# Altium footprint library Connectors_THT.PcbLib: 111 footprints (part 11 of 11)
Each footprint in its own frame and in the unit in brackets; x right, y up, seen from the top. Pads: shape width x height; smd on the part's side, far side on the other; paste and mask are expansions set on the pad; w line width, h text height; cw(c..) or ccw(c..) is an arc to the next point about the centre after c.
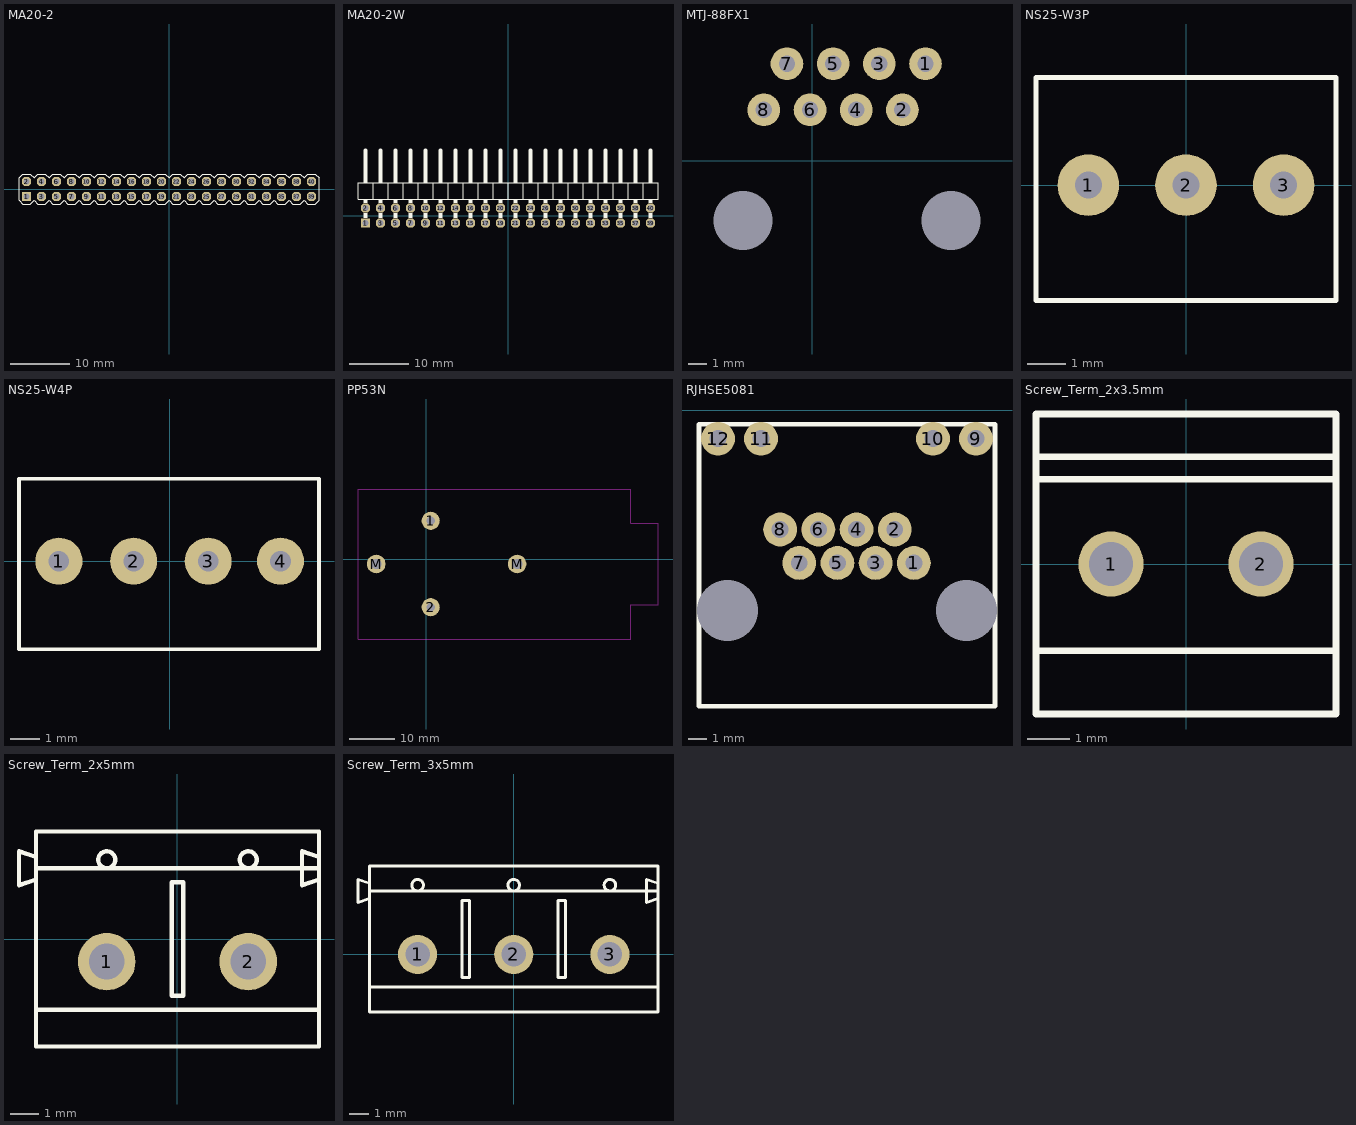
[diagram p10: the footprints below, top view; thin cyan lines are the x and y axes]

## MA20-2 [mil]
pads (40):
  rect 60x60 hole 40: 1(-950,-50)
  oct 60x60 hole 40: 2(-950,50) 3(-850,-50) 4(-850,50) 5(-750,-50) 6(-750,50) 7(-650,-50) 8(-650,50) 9(-550,-50) 10(-550,50) 11(-450,-50) 12(-450,50) 13(-350,-50) 14(-350,50) 15(-250,-50) 16(-250,50) 17(-150,-50) 18(-150,50) 19(-50,-50) 20(-50,50) 21(50,-50) 22(50,50) 23(150,-50) 24(150,50) 25(250,-50) 26(250,50) 27(350,-50) 28(350,50) 29(450,-50) 30(450,50) 31(550,-50) 32(550,50) 33(650,-50) 34(650,50) 35(750,-50) 36(750,50) 37(850,-50) 38(850,50) 39(950,-50) 40(950,50)
Top Overlay:
  lines w6: -1000,-75 -975,-100 -925,-100 -900,-75 -875,-100 -825,-100 -800,-75 -775,-100 -725,-100 -700,-75 -675,-100 -625,-100 -600,-75 -575,-100 -525,-100 -500,-75 -475,-100 -425,-100 -400,-75 -375,-100 -325,-100 -300,-75 -275,-100 -225,-100 -200,-75 -175,-100 -125,-100 -100,-75 -75,-100 -25,-100 0,-75 25,-100 75,-100 100,-75 125,-100 175,-100 200,-75 225,-100 275,-100 300,-75 325,-100 375,-100 400,-75 425,-100 475,-100 500,-75 525,-100 575,-100 600,-75 625,-100 675,-100 700,-75 725,-100 775,-100 800,-75 825,-100 875,-100 900,-75 925,-100 975,-100 1000,-75 1000,75 975,100 925,100 900,75 875,100 825,100 800,75 775,100 725,100 700,75 675,100 625,100 600,75 575,100 525,100 500,75 475,100 425,100 400,75 375,100 325,100 300,75 275,100 225,100 200,75 175,100 125,100 100,75 75,100 25,100 0,75 -25,100 -75,100 -100,75 -125,100 -175,100 -200,75 -225,100 -275,100 -300,75 -325,100 -375,100 -400,75 -425,100 -475,100 -500,75 -525,100 -575,100 -600,75 -625,100 -675,100 -700,75 -725,100 -775,100 -800,75 -825,100 -875,100 -900,75 -925,100 -975,100 -1000,75 -1000,-75
3D body: height 31.5, standoff 0, extent 437.51,-62.49 462.51,-37.49
3D body: height 338.58, standoff 0, extent 437.51,37.51 462.51,62.51
3D body: height 98.43, standoff 11.81, extent 400,-100 500,100
3D body: height 11.81, standoff 0, extent 400,75 500,100
3D body: height 11.81, standoff 0, extent 400,-100 500,-75
3D body: height 338.58, standoff 0, extent 437.51,-62.49 462.51,-37.49
3D body: height 31.5, standoff 0, extent 437.51,37.51 462.51,62.51
3D body: height 31.5, standoff 0, extent 537.51,-62.49 562.51,-37.49
3D body: height 338.58, standoff 0, extent 537.51,37.51 562.51,62.51
3D body: height 98.43, standoff 11.81, extent 500,-100 600,100
3D body: height 11.81, standoff 0, extent 500,75 600,100
3D body: height 11.81, standoff 0, extent 500,-100 600,-75
3D body: height 338.58, standoff 0, extent 537.51,-62.49 562.51,-37.49
3D body: height 31.5, standoff 0, extent 537.51,37.51 562.51,62.51
3D body: height 31.5, standoff 0, extent 637.51,-62.49 662.51,-37.49
3D body: height 338.58, standoff 0, extent 637.51,37.51 662.51,62.51
3D body: height 98.43, standoff 11.81, extent 600,-100 700,100
3D body: height 11.81, standoff 0, extent 600,75 700,100
3D body: height 11.81, standoff 0, extent 600,-100 700,-75
3D body: height 338.58, standoff 0, extent 637.51,-62.49 662.51,-37.49
3D body: height 31.5, standoff 0, extent 637.51,37.51 662.51,62.51
3D body: height 31.5, standoff 0, extent 737.51,-62.49 762.51,-37.49
3D body: height 338.58, standoff 0, extent 737.51,37.51 762.51,62.51
3D body: height 98.43, standoff 11.81, extent 700,-100 800,100
3D body: height 11.81, standoff 0, extent 700,75 800,100
3D body: height 11.81, standoff 0, extent 700,-100 800,-75
3D body: height 338.58, standoff 0, extent 737.51,-62.49 762.51,-37.49
3D body: height 31.5, standoff 0, extent 737.51,37.51 762.51,62.51
3D body: height 31.5, standoff 0, extent 837.51,-62.49 862.51,-37.49
3D body: height 338.58, standoff 0, extent 837.51,37.51 862.51,62.51
3D body: height 98.43, standoff 11.81, extent 800,-100 900,100
3D body: height 11.81, standoff 0, extent 800,75 900,100
3D body: height 11.81, standoff 0, extent 800,-100 900,-75
3D body: height 338.58, standoff 0, extent 837.51,-62.49 862.51,-37.49
3D body: height 31.5, standoff 0, extent 837.51,37.51 862.51,62.51
3D body: height 31.5, standoff 0, extent 937.51,-62.49 962.51,-37.49
3D body: height 338.58, standoff 0, extent 937.51,37.51 962.51,62.51
3D body: height 98.43, standoff 11.81, extent 900,-100 1000,100
3D body: height 11.81, standoff 0, extent 900,75 1000,100
3D body: height 11.81, standoff 0, extent 900,-100 1000,-75
3D body: height 338.58, standoff 0, extent 937.51,-62.49 962.51,-37.49
3D body: height 31.5, standoff 0, extent 937.51,37.51 962.51,62.51
3D body: height 31.5, standoff 0, extent -262.49,-62.49 -237.49,-37.49
3D body: height 338.58, standoff 0, extent -262.49,37.51 -237.49,62.51
3D body: height 98.43, standoff 11.81, extent -300,-100 -200,100
3D body: height 11.81, standoff 0, extent -300,75 -200,100
3D body: height 11.81, standoff 0, extent -300,-100 -200,-75
3D body: height 338.58, standoff 0, extent -262.49,-62.49 -237.49,-37.49
3D body: height 31.5, standoff 0, extent -262.49,37.51 -237.49,62.51
3D body: height 31.5, standoff 0, extent -162.49,-62.49 -137.49,-37.49
3D body: height 338.58, standoff 0, extent -162.49,37.51 -137.49,62.51
3D body: height 98.43, standoff 11.81, extent -200,-100 -100,100
3D body: height 11.81, standoff 0, extent -200,75 -100,100
3D body: height 11.81, standoff 0, extent -200,-100 -100,-75
3D body: height 338.58, standoff 0, extent -162.49,-62.49 -137.49,-37.49
3D body: height 31.5, standoff 0, extent -162.49,37.51 -137.49,62.51
3D body: height 31.5, standoff 0, extent -62.49,-62.49 -37.49,-37.49
3D body: height 338.58, standoff 0, extent -62.49,37.51 -37.49,62.51
3D body: height 98.43, standoff 11.81, extent -100,-100 0,100
3D body: height 11.81, standoff 0, extent -100,75 0,100
3D body: height 11.81, standoff 0, extent -100,-100 0,-75
3D body: height 338.58, standoff 0, extent -62.49,-62.49 -37.49,-37.49
3D body: height 31.5, standoff 0, extent -62.49,37.51 -37.49,62.51
3D body: height 31.5, standoff 0, extent 37.51,-62.49 62.51,-37.49
3D body: height 338.58, standoff 0, extent 37.51,37.51 62.51,62.51
3D body: height 98.43, standoff 11.81, extent 0,-100 100,100
3D body: height 11.81, standoff 0, extent 0,75 100,100
3D body: height 11.81, standoff 0, extent 0,-100 100,-75
3D body: height 338.58, standoff 0, extent 37.51,-62.49 62.51,-37.49
3D body: height 31.5, standoff 0, extent 37.51,37.51 62.51,62.51
3D body: height 31.5, standoff 0, extent 137.51,-62.49 162.51,-37.49
3D body: height 338.58, standoff 0, extent 137.51,37.51 162.51,62.51
3D body: height 98.43, standoff 11.81, extent 100,-100 200,100
3D body: height 11.81, standoff 0, extent 100,75 200,100
3D body: height 11.81, standoff 0, extent 100,-100 200,-75
3D body: height 338.58, standoff 0, extent 137.51,-62.49 162.51,-37.49
3D body: height 31.5, standoff 0, extent 137.51,37.51 162.51,62.51
3D body: height 31.5, standoff 0, extent 237.51,-62.49 262.51,-37.49
3D body: height 338.58, standoff 0, extent 237.51,37.51 262.51,62.51
3D body: height 98.43, standoff 11.81, extent 200,-100 300,100
3D body: height 11.81, standoff 0, extent 200,75 300,100
3D body: height 11.81, standoff 0, extent 200,-100 300,-75
3D body: height 338.58, standoff 0, extent 237.51,-62.49 262.51,-37.49
3D body: height 31.5, standoff 0, extent 237.51,37.51 262.51,62.51
3D body: height 31.5, standoff 0, extent 337.51,-62.49 362.51,-37.49
3D body: height 338.58, standoff 0, extent 337.51,37.51 362.51,62.51
3D body: height 98.43, standoff 11.81, extent 300,-100 400,100
3D body: height 11.81, standoff 0, extent 300,75 400,100
3D body: height 11.81, standoff 0, extent 300,-100 400,-75
3D body: height 338.58, standoff 0, extent 337.51,-62.49 362.51,-37.49
3D body: height 31.5, standoff 0, extent 337.51,37.51 362.51,62.51
3D body: height 31.5, standoff 0, extent -962.49,-62.49 -937.49,-37.49
3D body: height 338.58, standoff 0, extent -962.49,37.51 -937.49,62.51
3D body: height 98.43, standoff 11.81, extent -1000,-100 -900,100
3D body: height 11.81, standoff 0, extent -1000,75 -900,100
3D body: height 11.81, standoff 0, extent -1000,-100 -900,-75
3D body: height 338.58, standoff 0, extent -962.49,-62.49 -937.49,-37.49
3D body: height 31.5, standoff 0, extent -962.49,37.51 -937.49,62.51
3D body: height 31.5, standoff 0, extent -862.49,-62.49 -837.49,-37.49
3D body: height 338.58, standoff 0, extent -862.49,37.51 -837.49,62.51
3D body: height 98.43, standoff 11.81, extent -900,-100 -800,100
3D body: height 11.81, standoff 0, extent -900,75 -800,100
3D body: height 11.81, standoff 0, extent -900,-100 -800,-75
3D body: height 338.58, standoff 0, extent -862.49,-62.49 -837.49,-37.49
3D body: height 31.5, standoff 0, extent -862.49,37.51 -837.49,62.51
3D body: height 31.5, standoff 0, extent -762.49,-62.49 -737.49,-37.49
3D body: height 338.58, standoff 0, extent -762.49,37.51 -737.49,62.51
3D body: height 98.43, standoff 11.81, extent -800,-100 -700,100
3D body: height 11.81, standoff 0, extent -800,75 -700,100
3D body: height 11.81, standoff 0, extent -800,-100 -700,-75
3D body: height 338.58, standoff 0, extent -762.49,-62.49 -737.49,-37.49
3D body: height 31.5, standoff 0, extent -762.49,37.51 -737.49,62.51
3D body: height 31.5, standoff 0, extent -662.49,-62.49 -637.49,-37.49
3D body: height 338.58, standoff 0, extent -662.49,37.51 -637.49,62.51
3D body: height 98.43, standoff 11.81, extent -700,-100 -600,100
3D body: height 11.81, standoff 0, extent -700,75 -600,100
3D body: height 11.81, standoff 0, extent -700,-100 -600,-75
3D body: height 338.58, standoff 0, extent -662.49,-62.49 -637.49,-37.49
3D body: height 31.5, standoff 0, extent -662.49,37.51 -637.49,62.51
3D body: height 31.5, standoff 0, extent -562.49,-62.49 -537.49,-37.49
3D body: height 338.58, standoff 0, extent -562.49,37.51 -537.49,62.51
3D body: height 98.43, standoff 11.81, extent -600,-100 -500,100
3D body: height 11.81, standoff 0, extent -600,75 -500,100
3D body: height 11.81, standoff 0, extent -600,-100 -500,-75
3D body: height 338.58, standoff 0, extent -562.49,-62.49 -537.49,-37.49
3D body: height 31.5, standoff 0, extent -562.49,37.51 -537.49,62.51
3D body: height 31.5, standoff 0, extent -462.49,-62.49 -437.49,-37.49
3D body: height 338.58, standoff 0, extent -462.49,37.51 -437.49,62.51
3D body: height 98.43, standoff 11.81, extent -500,-100 -400,100
3D body: height 11.81, standoff 0, extent -500,75 -400,100
3D body: height 11.81, standoff 0, extent -500,-100 -400,-75
3D body: height 338.58, standoff 0, extent -462.49,-62.49 -437.49,-37.49
3D body: height 31.5, standoff 0, extent -462.49,37.51 -437.49,62.51
3D body: height 31.5, standoff 0, extent -362.49,-62.49 -337.49,-37.49
3D body: height 338.58, standoff 0, extent -362.49,37.51 -337.49,62.51
3D body: height 98.43, standoff 11.81, extent -400,-100 -300,100
3D body: height 11.81, standoff 0, extent -400,75 -300,100
3D body: height 11.81, standoff 0, extent -400,-100 -300,-75
3D body: height 338.58, standoff 0, extent -362.49,-62.49 -337.49,-37.49
3D body: height 31.5, standoff 0, extent -362.49,37.51 -337.49,62.51

## MA20-2W [mil]
pads (40):
  rect 60x60 hole 40: 1(-950,-50)
  oct 60x60 hole 40: 2(-950,50) 3(-850,-50) 4(-850,50) 5(-750,-50) 6(-750,50) 7(-650,-50) 8(-650,50) 9(-550,-50) 10(-550,50) 11(-450,-50) 12(-450,50) 13(-350,-50) 14(-350,50) 15(-250,-50) 16(-250,50) 17(-150,-50) 18(-150,50) 19(-50,-50) 20(-50,50) 21(50,-50) 22(50,50) 23(150,-50) 24(150,50) 25(250,-50) 26(250,50) 27(350,-50) 28(350,50) 29(450,-50) 30(450,50) 31(550,-50) 32(550,50) 33(650,-50) 34(650,50) 35(750,-50) 36(750,50) 37(850,-50) 38(850,50) 39(950,-50) 40(950,50)
Top Overlay:
  rectangle: 937,-16 963,16
  rectangle: 837,-16 863,16
  rectangle: 737,-16 763,16
  rectangle: 637,-16 663,16
  rectangle: 537,-16 563,16
  rectangle: 437,-16 463,16
  rectangle: 337,-16 363,16
  rectangle: 237,-16 263,16
  rectangle: 137,-16 163,16
  rectangle: 37,-16 63,16
  rectangle: -63,-16 -37,16
  rectangle: -163,-16 -137,16
  rectangle: -263,-16 -237,16
  rectangle: -363,-16 -337,16
  rectangle: -463,-16 -437,16
  rectangle: -563,-16 -537,16
  rectangle: -663,-16 -637,16
  rectangle: -763,-16 -737,16
  rectangle: -863,-16 -837,16
  rectangle: -963,-16 -937,16
  rectangle: -963,84 -937,110
  rectangle: -863,84 -837,110
  rectangle: -763,84 -737,110
  rectangle: -663,84 -637,110
  rectangle: -563,84 -537,110
  rectangle: -463,84 -437,110
  rectangle: -363,84 -337,110
  rectangle: -263,84 -237,110
  rectangle: -163,84 -137,110
  rectangle: -63,84 -37,110
  rectangle: 37,84 63,110
  rectangle: 137,84 163,110
  rectangle: 237,84 263,110
  rectangle: 337,84 363,110
  rectangle: 437,84 463,110
  rectangle: 537,84 563,110
  rectangle: 937,84 963,110
  rectangle: 837,84 863,110
  rectangle: 737,84 763,110
  rectangle: 637,84 663,110
  rectangle: -563,220 -537,250
  rectangle: -663,220 -637,250
  rectangle: -763,220 -737,250
  rectangle: -863,220 -837,250
  rectangle: -963,220 -937,250
  rectangle: -63,220 -37,250
  rectangle: -163,220 -137,250
  rectangle: -263,220 -237,250
  rectangle: -363,220 -337,250
  rectangle: -463,220 -437,250
  rectangle: 437,220 463,250
  rectangle: 337,220 363,250
  rectangle: 237,220 263,250
  rectangle: 137,220 163,250
  rectangle: 37,220 63,250
  rectangle: 937,220 963,250
  rectangle: 837,220 863,250
  rectangle: 737,220 763,250
  rectangle: 637,220 663,250
  rectangle: 537,220 563,250
  lines w6: -900,110 -800,110 ; -900,110 -1000,110 -1000,220 -900,220 ; -900,110 -900,220 ; -900,220 -800,220 ; -800,110 -800,220 ; -800,110 -700,110 ; -800,220 -700,220 ; -700,110 -700,220 ; -700,110 -600,110 ; -700,220 -600,220 ; -600,110 -600,220 ; -600,110 -500,110 ; -600,220 -500,220 ; -500,110 -500,220 ; -500,110 -400,110 ; -500,220 -400,220 ; -400,110 -300,110 ; -400,110 -400,220 ; -400,220 -300,220 ; -300,110 -300,220 ; -300,110 -200,110 ; -300,220 -200,220 ; -200,110 -200,220 ; -200,110 -100,110 ; -200,220 -100,220 ; -100,110 -100,220 ; -100,110 0,110 ; -100,220 0,220 ; 0,110 0,220 ; 0,110 100,110 ; 0,220 100,220 ; 100,110 200,110 ; 100,110 100,220 ; 100,220 200,220 ; 200,110 200,220 ; 200,110 300,110 ; 200,220 300,220 ; 300,110 300,220 ; 300,110 400,110 ; 300,220 400,220 ; 400,110 400,220 ; 400,110 500,110 ; 400,220 500,220 ; 500,110 500,220 ; 500,110 600,110 ; 500,220 600,220 ; 600,110 700,110 ; 600,110 600,220 ; 600,220 700,220 ; 700,110 700,220 ; 700,110 800,110 ; 700,220 800,220 ; 800,110 800,220 ; 800,110 900,110 ; 800,220 900,220 ; 900,110 900,220 ; 900,110 1000,110 1000,220 900,220
  lines w26: -950,250 -950,435 ; -850,250 -850,435 ; -750,250 -750,435 ; -650,250 -650,435 ; -550,250 -550,435 ; -450,250 -450,435 ; -350,250 -350,435 ; -250,250 -250,435 ; -150,250 -150,435 ; -50,250 -50,435 ; 50,250 50,435 ; 150,250 150,435 ; 250,250 250,435 ; 350,250 350,435 ; 450,250 450,435 ; 550,250 550,435 ; 650,250 650,435 ; 750,250 750,435 ; 850,250 850,435 ; 950,250 950,435
3D body: height 31.5, standoff 0, extent -562.49,-62.49 -537.49,-37.49
3D body: height 31.5, standoff 0, extent -562.49,37.51 -537.49,62.51
3D body: height 31.5, standoff 0, extent -662.49,-62.49 -637.49,-37.49
3D body: height 31.5, standoff 0, extent -662.49,37.51 -637.49,62.51
3D body: height 31.5, standoff 0, extent -762.49,37.51 -737.49,62.51
3D body: height 31.5, standoff 0, extent -762.49,-62.49 -737.49,-37.49
3D body: height 31.5, standoff 0, extent -862.49,-62.49 -837.49,-37.49
3D body: height 31.5, standoff 0, extent -862.49,37.51 -837.49,62.51
3D body: height 31.5, standoff 0, extent -962.5,-62.5 -937.5,-37.5
3D body: height 31.5, standoff 0, extent -962.49,37.5 -937.49,62.5
3D body: height 162.48, standoff 137.52, extent -962.5,-62.5 -937.5,443.75
3D body: height 162.48, standoff 0, extent -962.5,-62.5 -937.5,-37.5
3D body: height 62.48, standoff 0, extent -962.49,37.51 -937.49,62.51
3D body: height 200, standoff 0, extent -1000,110 -900,220
3D body: height 62.5, standoff 37.5, extent -962.5,37.51 -937.5,443.75
3D body: height 62.5, standoff 37.5, extent -862.49,37.51 -837.49,443.76
3D body: height 200, standoff 0, extent -900,110 -800,220
3D body: height 62.48, standoff 0, extent -862.49,37.51 -837.49,62.51
3D body: height 162.48, standoff 0, extent -862.49,-62.49 -837.49,-37.49
3D body: height 162.48, standoff 137.52, extent -862.5,-62.49 -837.5,443.76
3D body: height 62.5, standoff 37.5, extent -762.49,37.51 -737.49,443.76
3D body: height 200, standoff 0, extent -800,110 -700,220
3D body: height 62.48, standoff 0, extent -762.49,37.51 -737.49,62.51
3D body: height 162.48, standoff 0, extent -762.49,-62.49 -737.49,-37.49
3D body: height 162.48, standoff 137.52, extent -762.5,-62.49 -737.5,443.76
3D body: height 62.5, standoff 37.5, extent -662.49,37.51 -637.49,443.76
3D body: height 200, standoff 0, extent -700,110 -600,220
3D body: height 62.48, standoff 0, extent -662.49,37.51 -637.49,62.51
3D body: height 162.48, standoff 0, extent -662.49,-62.49 -637.49,-37.49
3D body: height 162.48, standoff 137.52, extent -662.5,-62.49 -637.5,443.76
3D body: height 62.5, standoff 37.5, extent -562.49,37.51 -537.49,443.76
3D body: height 200, standoff 0, extent -600,110 -500,220
3D body: height 62.48, standoff 0, extent -562.49,37.51 -537.49,62.51
3D body: height 162.48, standoff 0, extent -562.49,-62.49 -537.49,-37.49
3D body: height 162.48, standoff 137.52, extent -562.5,-62.49 -537.5,443.76
3D body: height 31.5, standoff 0, extent -62.49,-62.49 -37.49,-37.49
3D body: height 31.5, standoff 0, extent -62.49,37.51 -37.49,62.51
3D body: height 31.5, standoff 0, extent -162.49,-62.49 -137.49,-37.49
3D body: height 31.5, standoff 0, extent -162.49,37.51 -137.49,62.51
3D body: height 31.5, standoff 0, extent -262.49,37.51 -237.49,62.51
3D body: height 31.5, standoff 0, extent -262.49,-62.49 -237.49,-37.49
3D body: height 31.5, standoff 0, extent -362.49,-62.49 -337.49,-37.49
3D body: height 31.5, standoff 0, extent -362.49,37.51 -337.49,62.51
3D body: height 31.5, standoff 0, extent -462.5,-62.5 -437.5,-37.5
3D body: height 31.5, standoff 0, extent -462.49,37.5 -437.49,62.5
3D body: height 162.48, standoff 137.52, extent -462.5,-62.5 -437.5,443.75
3D body: height 162.48, standoff 0, extent -462.5,-62.5 -437.5,-37.5
3D body: height 62.48, standoff 0, extent -462.49,37.51 -437.49,62.51
3D body: height 200, standoff 0, extent -500,110 -400,220
3D body: height 62.5, standoff 37.5, extent -462.5,37.51 -437.5,443.75
3D body: height 62.5, standoff 37.5, extent -362.49,37.51 -337.49,443.76
3D body: height 200, standoff 0, extent -400,110 -300,220
3D body: height 62.48, standoff 0, extent -362.49,37.51 -337.49,62.51
3D body: height 162.48, standoff 0, extent -362.49,-62.49 -337.49,-37.49
3D body: height 162.48, standoff 137.52, extent -362.5,-62.49 -337.5,443.76
3D body: height 62.5, standoff 37.5, extent -262.49,37.51 -237.49,443.76
3D body: height 200, standoff 0, extent -300,110 -200,220
3D body: height 62.48, standoff 0, extent -262.49,37.51 -237.49,62.51
3D body: height 162.48, standoff 0, extent -262.49,-62.49 -237.49,-37.49
3D body: height 162.48, standoff 137.52, extent -262.5,-62.49 -237.5,443.76
3D body: height 62.5, standoff 37.5, extent -162.49,37.51 -137.49,443.76
3D body: height 200, standoff 0, extent -200,110 -100,220
3D body: height 62.48, standoff 0, extent -162.49,37.51 -137.49,62.51
3D body: height 162.48, standoff 0, extent -162.49,-62.49 -137.49,-37.49
3D body: height 162.48, standoff 137.52, extent -162.5,-62.49 -137.5,443.76
3D body: height 62.5, standoff 37.5, extent -62.49,37.51 -37.49,443.76
3D body: height 200, standoff 0, extent -100,110 0,220
3D body: height 62.48, standoff 0, extent -62.49,37.51 -37.49,62.51
3D body: height 162.48, standoff 0, extent -62.49,-62.49 -37.49,-37.49
3D body: height 162.48, standoff 137.52, extent -62.5,-62.49 -37.5,443.76
3D body: height 31.5, standoff 0, extent 437.51,-62.49 462.51,-37.49
3D body: height 31.5, standoff 0, extent 437.51,37.51 462.51,62.51
3D body: height 31.5, standoff 0, extent 337.51,-62.49 362.51,-37.49
3D body: height 31.5, standoff 0, extent 337.51,37.51 362.51,62.51
3D body: height 31.5, standoff 0, extent 237.51,37.51 262.51,62.51
3D body: height 31.5, standoff 0, extent 237.51,-62.49 262.51,-37.49
3D body: height 31.5, standoff 0, extent 137.51,-62.49 162.51,-37.49
3D body: height 31.5, standoff 0, extent 137.51,37.51 162.51,62.51
3D body: height 31.5, standoff 0, extent 37.5,-62.5 62.5,-37.5
3D body: height 31.5, standoff 0, extent 37.51,37.5 62.51,62.5
3D body: height 162.48, standoff 137.52, extent 37.5,-62.5 62.5,443.75
3D body: height 162.48, standoff 0, extent 37.5,-62.5 62.5,-37.5
3D body: height 62.48, standoff 0, extent 37.51,37.51 62.51,62.51
3D body: height 200, standoff 0, extent 0,110 100,220
3D body: height 62.5, standoff 37.5, extent 37.5,37.51 62.5,443.75
3D body: height 62.5, standoff 37.5, extent 137.51,37.51 162.51,443.76
3D body: height 200, standoff 0, extent 100,110 200,220
3D body: height 62.48, standoff 0, extent 137.51,37.51 162.51,62.51
3D body: height 162.48, standoff 0, extent 137.51,-62.49 162.51,-37.49
3D body: height 162.48, standoff 137.52, extent 137.5,-62.49 162.5,443.76
3D body: height 62.5, standoff 37.5, extent 237.51,37.51 262.51,443.76
3D body: height 200, standoff 0, extent 200,110 300,220
3D body: height 62.48, standoff 0, extent 237.51,37.51 262.51,62.51
3D body: height 162.48, standoff 0, extent 237.51,-62.49 262.51,-37.49
3D body: height 162.48, standoff 137.52, extent 237.5,-62.49 262.5,443.76
3D body: height 62.5, standoff 37.5, extent 337.51,37.51 362.51,443.76
3D body: height 200, standoff 0, extent 300,110 400,220
3D body: height 62.48, standoff 0, extent 337.51,37.51 362.51,62.51
3D body: height 162.48, standoff 0, extent 337.51,-62.49 362.51,-37.49
3D body: height 162.48, standoff 137.52, extent 337.5,-62.49 362.5,443.76
3D body: height 62.5, standoff 37.5, extent 437.51,37.51 462.51,443.76
3D body: height 200, standoff 0, extent 400,110 500,220
3D body: height 62.48, standoff 0, extent 437.51,37.51 462.51,62.51
3D body: height 162.48, standoff 0, extent 437.51,-62.49 462.51,-37.49
3D body: height 162.48, standoff 137.52, extent 437.5,-62.49 462.5,443.76
3D body: height 31.5, standoff 0, extent 937.51,-62.49 962.51,-37.49
3D body: height 31.5, standoff 0, extent 937.51,37.51 962.51,62.51
3D body: height 31.5, standoff 0, extent 837.51,-62.49 862.51,-37.49
3D body: height 31.5, standoff 0, extent 837.51,37.51 862.51,62.51
3D body: height 31.5, standoff 0, extent 737.51,37.51 762.51,62.51
3D body: height 31.5, standoff 0, extent 737.51,-62.49 762.51,-37.49
3D body: height 31.5, standoff 0, extent 637.51,-62.49 662.51,-37.49
3D body: height 31.5, standoff 0, extent 637.51,37.51 662.51,62.51
3D body: height 31.5, standoff 0, extent 537.5,-62.5 562.5,-37.5
3D body: height 31.5, standoff 0, extent 537.51,37.5 562.51,62.5
3D body: height 162.48, standoff 137.52, extent 537.5,-62.5 562.5,443.75
3D body: height 162.48, standoff 0, extent 537.5,-62.5 562.5,-37.5
3D body: height 62.48, standoff 0, extent 537.51,37.51 562.51,62.51
3D body: height 200, standoff 0, extent 500,110 600,220
3D body: height 62.5, standoff 37.5, extent 537.5,37.51 562.5,443.75
3D body: height 62.5, standoff 37.5, extent 637.51,37.51 662.51,443.76
3D body: height 200, standoff 0, extent 600,110 700,220
3D body: height 62.48, standoff 0, extent 637.51,37.51 662.51,62.51
3D body: height 162.48, standoff 0, extent 637.51,-62.49 662.51,-37.49
3D body: height 162.48, standoff 137.52, extent 637.5,-62.49 662.5,443.76
3D body: height 62.5, standoff 37.5, extent 737.51,37.51 762.51,443.76
3D body: height 200, standoff 0, extent 700,110 800,220
3D body: height 62.48, standoff 0, extent 737.51,37.51 762.51,62.51
3D body: height 162.48, standoff 0, extent 737.51,-62.49 762.51,-37.49
3D body: height 162.48, standoff 137.52, extent 737.5,-62.49 762.5,443.76
3D body: height 62.5, standoff 37.5, extent 837.51,37.51 862.51,443.76
3D body: height 200, standoff 0, extent 800,110 900,220
3D body: height 62.48, standoff 0, extent 837.51,37.51 862.51,62.51
3D body: height 162.48, standoff 0, extent 837.51,-62.49 862.51,-37.49
3D body: height 162.48, standoff 137.52, extent 837.5,-62.49 862.5,443.76
3D body: height 62.5, standoff 37.5, extent 937.51,37.51 962.51,443.76
3D body: height 200, standoff 0, extent 900,110 1000,220
3D body: height 62.48, standoff 0, extent 937.51,37.51 962.51,62.51
3D body: height 162.48, standoff 0, extent 937.51,-62.49 962.51,-37.49
3D body: height 162.48, standoff 137.52, extent 937.5,-62.49 962.5,443.76

## MTJ-88FX1 [mm]
pads (10):
  round 1.8 hole 0.9: 1(6.223,5.334) 2(4.953,2.794) 3(3.683,5.334) 4(2.413,2.794) 5(1.143,5.334) 6(-0.127,2.794) 7(-1.397,5.334) 8(-2.667,2.794)
  round 0 hole 3.25: M(-3.81,-3.302) M(7.62,-3.302)
Top Layer:
  lines w0.25: -3.81,-3.302 -3.595,-3.302
Bottom Overlay:
  lines w0.25: -5.595,-9.809 -5.595,6.691 9.405,6.691 9.405,-9.809 -5.595,-9.809
3D body: height 16.55, standoff -3.95, extent -5.608,-9.829 9.672,6.731

## NS25-W3P [mm]
pads (3):
  round 1.6 hole 0.7: 1(-2.54,0) 2(0,0) 3(2.54,0)
Top Overlay:
  lines w0.125: -3.9,-3 -3.9,2.8 3.9,2.8 3.9,-3 -3.9,-3
3D body: height 3.3, standoff 0, extent -3.9,-3 3.9,2.8
3D body: height 11.5, standoff 3.3, extent -3.9,2 3.9,2.8
3D body: height 10.9, standoff -3.3, extent -2.857,-0.319 -2.22,0.319
3D body: height 10.9, standoff -3.3, extent -0.317,-0.319 0.32,0.319
3D body: height 10.9, standoff -3.3, extent 2.223,-0.319 2.86,0.319

## NS25-W4P [mm]
pads (4):
  round 1.6 hole 0.7: 1(-3.77,0) 2(-1.23,0) 3(1.31,0) 4(3.77,0)
Top Overlay:
  lines w0.125: 2.67,-3 -5.13,-3 ; -5.13,-3 -5.13,2.8 2.67,2.8 5.08,2.8 5.08,-3 -5.13,-3
3D body: height 10.9, standoff -3.3, extent 0.993,-0.319 1.63,0.319
3D body: height 10.9, standoff -3.3, extent -1.547,-0.319 -0.91,0.319
3D body: height 10.9, standoff -3.3, extent -4.087,-0.319 -3.45,0.319
3D body: height 11.5, standoff 3.3, extent -5.13,2 5,2.8
3D body: height 3.3, standoff 0, extent -5.13,-3 5,2.8
3D body: height 10.9, standoff -3.3, extent 3.453,-0.319 4.09,0.32

## PP53N [mm]
pads (4):
  round 4 hole 1.8: 1(1,8.5) 2(1,-10.5)
  round 4.1 hole 2.3: M(-11,-1) M(20,-1)
Keep-Out Layer:
  lines w0.2: 45,8 51,8 51,-10 45,-10 45,-17.5 -15,-17.5 -15,15.5 45,15.5 45,8 ; 45,8 45,8

## RJHSE5081 [mm]
pads (14):
  round 1.8 hole 0.9: 1(-11.176,-8.128) 2(-12.192,-6.35) 3(-13.208,-8.128) 4(-14.224,-6.35) 5(-15.24,-8.128) 6(-16.256,-6.35) 7(-17.272,-8.128) 8(-18.288,-6.35) 9(-7.874,-1.524) 10(-10.16,-1.524) 11(-19.304,-1.524) 12(-21.59,-1.524)
  round 0 hole 3.25: M(-21.082,-10.668) M(-8.382,-10.668)
Top Layer:
  lines w0.25: -17.018,-6.35 -16.256,-6.35
Top Overlay:
  lines w0.25: -22.606,-15.748 -6.858,-15.748 -6.858,-0.762 -22.606,-0.762 -22.606,-15.748
3D body: height 15.06, standoff -1.33, extent -22.669,-16.122 -6.921,-0.736

## Screw_Term_2x3.5mm [mil]
pads (2):
  round 60 hole 40: 1(-68.9,0) 2(68.9,0)
Top Overlay:
  lines w6: -137.8,-79.72 137.8,-79.72 ; -137.8,77.76 137.8,77.76 ; -137.8,98.43 137.8,98.43 ; -137.8,-137.8 -137.8,137.8 137.8,137.8 137.8,-137.8 -137.8,-137.8
3D body: height 335.04, standoff -137.8, extent -140,-136.62 140,150.39

## Screw_Term_2x5mm [mil]
pads (2):
  round 80 hole 50: 1(-98.43,-31.5) 2(98.43,-31.5)
Top Overlay:
  circle w6: c-98.43,110.24 r11.81
  circle w6: c98.43,110.24 r11.81
  lines w6: -196.85,-98.43 196.85,-98.43 ; -196.85,98.43 196.85,98.43 ; -196.85,82.68 -196.85,114.17 ; -196.85,82.68 -196.85,-149.61 196.85,-149.61 196.85,82.68 ; -196.85,82.68 -220.47,74.8 -220.47,122.05 -196.85,114.17 ; -196.85,114.17 -196.85,149.61 196.85,149.61 196.85,114.17 ; 196.85,82.68 196.85,114.17 ; 196.85,82.68 173.23,74.8 173.23,122.05 196.85,114.17 ; -7.87,-78.74 -7.87,78.74 7.87,78.74 7.87,-78.74 -7.87,-78.74
3D body: height 393.7, standoff -118.11, extent -220.47,-149.6 196.86,149.61

## Screw_Term_3x5mm [mil]
pads (3):
  round 80 hole 50: 1(-196.85,0) 2(0,0) 3(196.85,0)
Top Overlay:
  circle w6: c196.85,141.73 r11.81
  circle w6: c-196.85,141.73 r11.81
  circle w6: c0,141.73 r11.81
  lines w6: -295.28,-66.93 295.28,-66.93 ; -295.28,129.92 271.65,129.92 295.28,129.92 ; -295.28,114.17 -295.28,145.67 ; -295.28,114.17 -295.28,-118.11 295.28,-118.11 295.28,114.17 ; -295.28,114.17 -318.9,106.3 -318.9,153.54 -295.28,145.67 ; -295.28,145.67 -295.28,181.1 295.28,181.1 295.28,145.67 ; 295.28,114.17 295.28,145.67 ; 295.28,114.17 271.65,106.3 271.65,153.54 295.28,145.67 ; -106.3,-47.24 -90.55,-47.24 -90.55,110.24 -106.3,110.24 -106.3,-47.24 ; 90.55,-47.24 90.55,110.24 106.3,110.24 106.3,-47.24 90.55,-47.24
3D body: height 393.7, standoff -118.11, extent -318.89,-118.1 295.29,181.11